# Altium footprint library Power_Lib_Altium.PcbLib: 383 footprints (part 5 of 24)
Each footprint in its own frame and in the unit in brackets; x right, y up, seen from the top. Pads: shape width x height; smd on the part's side, far side on the other; paste and mask are expansions set on the pad; w line width, h text height; cw(c..) or ccw(c..) is an arc to the next point about the centre after c.
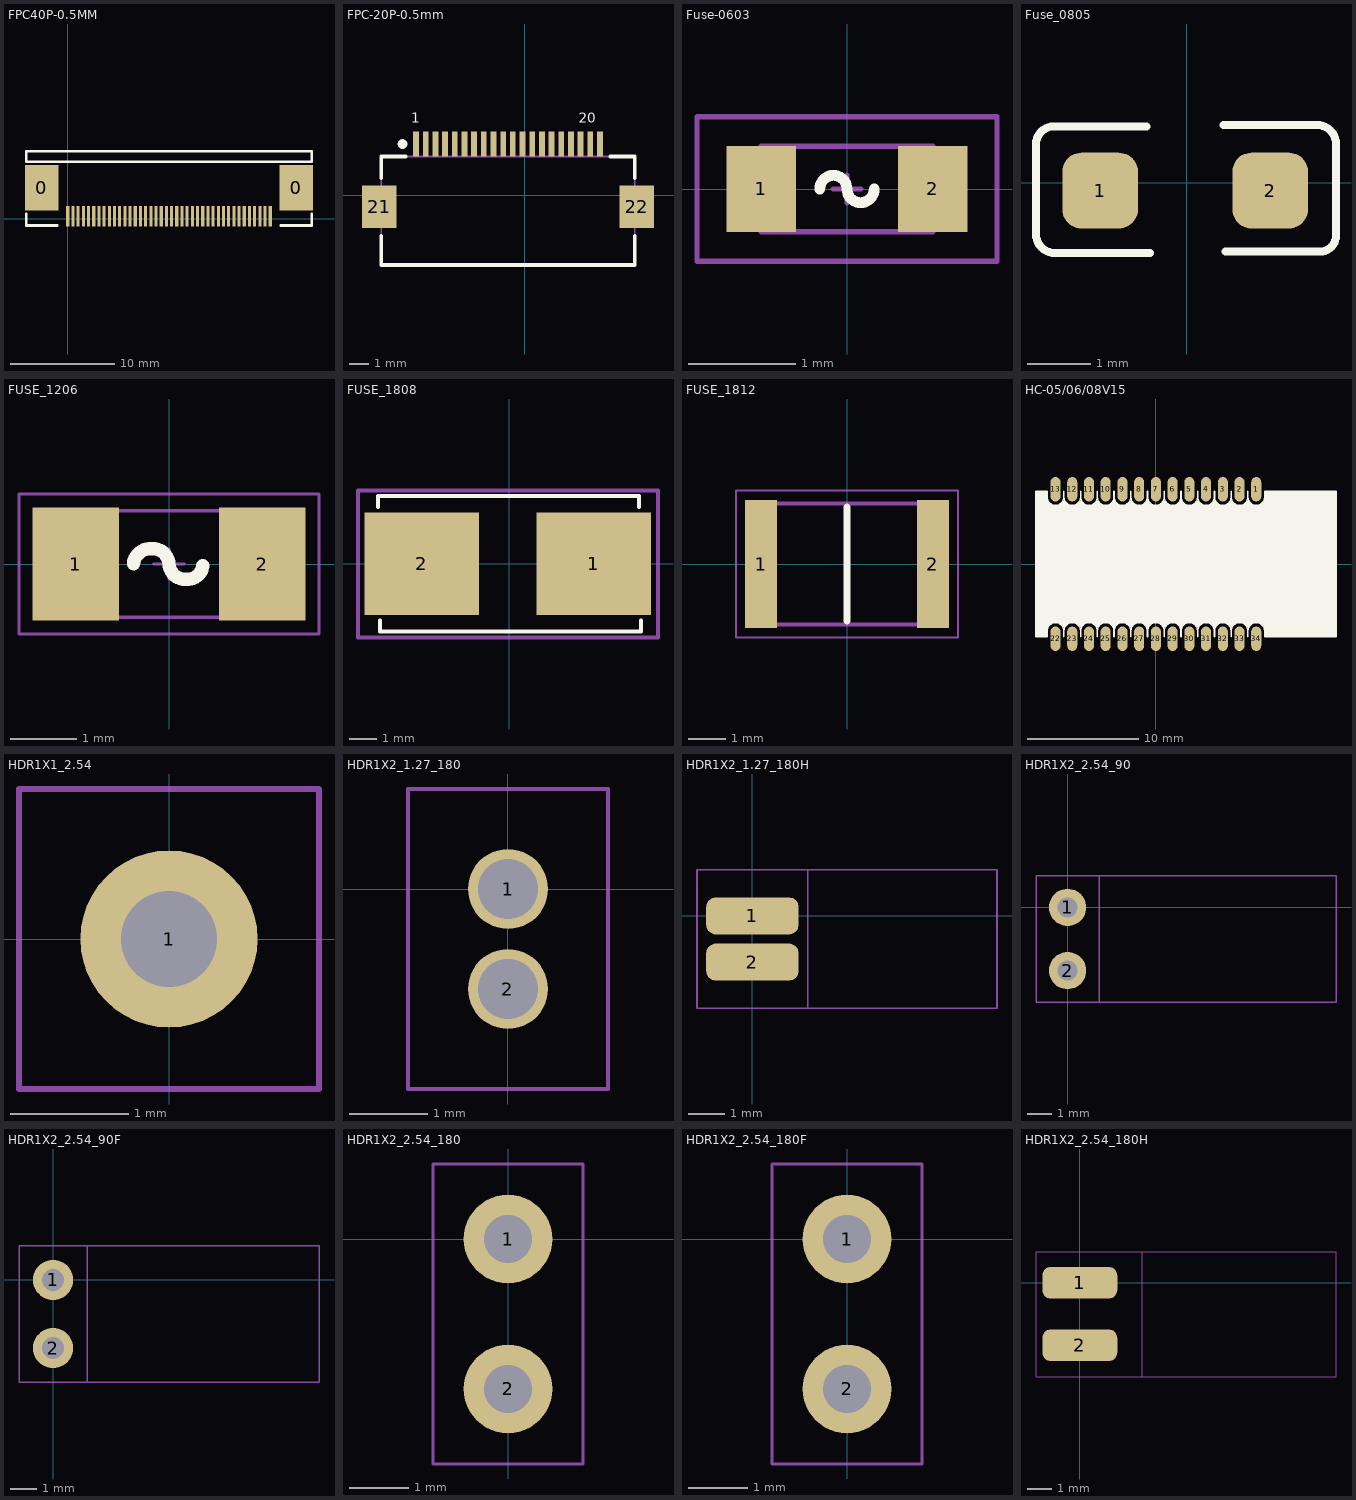
[diagram p4: the footprints below, top view; thin cyan lines are the x and y axes]

## FPC40P-0.5MM [mm]
height 1.6
pads (42):
  rect 3.2x4.4 smd: 0(-2.5,3) 0(22,3)
  rect 0.3x2 smd: 1(19.5,0.254) 2(19,0.254) 3(18.5,0.254) 4(18,0.254) 5(17.5,0.254) 6(17,0.254) 7(16.5,0.254) 8(16,0.254) 9(15.5,0.254) 10(15,0.254) 11(14.5,0.254) 12(14,0.254) 13(13.5,0.254) 14(13,0.254) 15(12.5,0.254) 16(12,0.254) 17(11.5,0.254) 18(11,0.254) 19(10.5,0.254) 20(10,0.254) 21(9.5,0.254) 22(9,0.254) 23(8.5,0.254) 24(8,0.254) 25(7.5,0.254) 26(7,0.254) 27(6.5,0.254) 28(6,0.254) 29(5.5,0.254) 30(5,0.254) 31(4.5,0.254) 32(4,0.254) 33(3.5,0.254) 34(3,0.254) 35(2.5,0.254) 36(2,0.254) 37(1.5,0.254) 38(1,0.254) 39(0.5,0.254) 40(0,0.254)
Top Overlay:
  lines w0.254: -4,0.5 -4,-0.635 -1.016,-0.635 ; 20.5,-0.635 23.5,-0.635 23.5,0.5 ; -4,5.5 -4,6.5 23.5,6.5 23.5,5.5 -4,5.5

## FPC-20P-0.5mm [mm]
pads (22):
  rect 0.3x1.3 smd: 1(-5.608,2.644) 2(-5.108,2.644) 3(-4.608,2.644) 4(-4.108,2.644) 5(-3.608,2.644) 6(-3.108,2.644) 7(-2.608,2.644) 8(-2.108,2.644) 9(-1.608,2.644) 10(-1.108,2.644) 11(-0.608,2.644) 12(-0.108,2.644) 13(0.392,2.644) 14(0.892,2.644) 15(1.392,2.644) 16(1.892,2.644) 17(2.392,2.644) 18(2.892,2.644) 19(3.392,2.644) 20(3.892,2.644)
  rect 1.8x2.2 smd: 21(-7.508,-0.606) 22(5.792,-0.604)
Top Overlay:
  circle w0.25: c-6.308,2.644 r0.125
  lines w0.2: -7.408,-2.104 -7.408,-3.604 5.692,-3.604 5.692,-2.104 ; -7.408,0.896 -7.408,1.996 -6.158,1.996 ; 4.442,1.996 5.692,1.996 5.692,0.896
  text "20" at 2.792,3.744 h0.5
  text "1" at -5.858,3.744 h0.5
Mechanical 13:
  lines w0.1: -7.408,-3.604 5.692,-3.604 5.692,1.996 -7.408,1.996 -7.408,-3.604
3D body: height 2, standoff 0, extent -7.408,-3.604 5.692,1.996

## Fuse-0603 [mm]
height 0.35
pads (2):
  rect 0.65x0.8 smd: 1(-0.8,0) 2(0.8,0)
Top Overlay:
  lines w0.1: -0.254,0 cw(c-0.127,0) -0.127,0.127 cw(c-0.127,0) 0,0 ccw(c0.127,0) 0.127,-0.127 ccw(c0.127,0) 0.254,0
Mechanical 13:
  lines w0.051: -0.127,0 0.127,0 ; 0,-0.127 0,0.127 ; -0.8,-0.4 -0.8,0.4 0.8,0.4 0.8,-0.4 -0.8,-0.4
Mechanical 14:
  lines w0.051: -1.4,-0.675 1.4,-0.675 1.4,0.675 -1.4,0.675 -1.4,-0.675
3D body "RESC1608X05L.step": height 0.45, standoff 0, extent -0.8,-0.4 0.8,0.4

## Fuse_0805 [mm] "500mA保险丝"
pads (2):
  rrect50% 1.2x1.2 smd: 1(-1.372,-0.127) 2(1.321,-0.127)
Top Overlay:
  lines w0.127: -0.635,0.889 -2.108,0.889 ccw(c-2.108,0.61) -2.388,0.61 -2.388,-0.813 ccw(c-2.083,-0.813) -2.083,-1.118 -0.584,-1.118 ; 0.584,0.914 2.057,0.914 cw(c2.057,0.61) 2.362,0.61 2.362,-0.838 cw(c2.108,-0.838) 2.108,-1.092 0.61,-1.092
3D body "User Library-fuse0805L050WR.SLDPRT": height 1.24, standoff 0, extent -1.105,-0.876 1.105,0.622

## FUSE_1206 [mm]
pads (2):
  rect 1.3x1.7 smd: 1(-1.4,0) 2(1.4,0)
Top Overlay:
  lines w0.2: -0.533,0 cw(c-0.279,-0.025) -0.254,0.229 cw(c-0.241,-0.013) 0,0 ccw(c0.241,0.013) 0.254,-0.229 ccw(c0.279,0) 0.508,-0.025
Mechanical 13:
  lines w0.051: -0.229,0 0.229,0 ; 0,-0.229 0,0.229 ; -1.6,-0.8 -1.6,0.8 1.6,0.8 1.6,-0.8 -1.6,-0.8
Mechanical 14:
  lines w0.051: -2.25,-1.05 2.25,-1.05 2.25,1.05 -2.25,1.05 -2.25,-1.05
3D body "R_1206.STEP": height 1.01, standoff -0.01, extent -1.6,-0.8 1.6,0.8

## FUSE_1808 [mm] "1808/2410保险丝座"
height 3
pads (2):
  rect 4.24x3.81 smd: 1(3.125,0) 2(-3.25,0)
Top Overlay:
  lines w0.15: -4.877,2.108 -4.877,2.515 4.801,2.515 4.801,2.108 ; -4.801,-2.108 -4.801,-2.515 4.877,-2.515 4.877,-2.108
Mechanical 14:
  lines w0.15: -5.613,-2.743 -5.613,2.718 5.512,2.718 5.512,-2.743 -5.613,-2.743
3D body "1808 Holder and Fuse.STEP": height 3.74, standoff 0.04, extent -4.9,-2.475 4.8,2.525

## FUSE_1812 [mm]
pads (2):
  rect 0.85x3.43 smd: 1(-2.3,0) 2(2.3,0)
Top Overlay:
  lines w0.2: 0,-1.52 0,1.52
Mechanical 13:
  lines w0.1: -2.275,-1.62 2.275,-1.62 2.275,1.62 -2.275,1.62 -2.275,-1.62
Mechanical 15:
  lines w0.05: -2.975,-1.965 2.975,-1.965 2.975,1.965 -2.975,1.965 -2.975,-1.965
3D body "MF-MSMF050-2.stp": height 0.85, standoff 0, extent -2.275,-1.62 2.275,1.62

## HC-05/06/08V15 [mm]
pads (26):
  oval 0.9x2.2 smd: 1(9,6.7) 2(7.5,6.7) 3(6,6.7) 4(4.5,6.7) 5(3,6.7) 6(1.5,6.7) 7(0,6.7) 8(-1.5,6.7) 9(-3,6.7) 10(-4.5,6.7) 11(-6,6.7) 12(-7.5,6.7) 13(-9,6.7) 22(-9,-6.7) 23(-7.5,-6.7) 24(-6,-6.7) 25(-4.5,-6.7) 26(-3,-6.7) 27(-1.5,-6.7) 28(0,-6.7) 29(1.5,-6.7) 30(3,-6.7) 31(4.5,-6.7) 32(6,-6.7) 33(7.5,-6.7) 34(9,-6.7)
Top Overlay:
  rectangle: -9.75,-5.675 -9.6,-5.475
  rectangle: -9.75,-5.475 -9.425,-5.3
  rectangle: -9.75,5.475 -9.6,5.675
  rectangle: -9.75,5.3 -9.425,5.475
  rectangle: -9.75,-5.3 9.75,5.3
  rectangle: 9.75,-6.5 16.15,6.5
  rectangle: -10.75,-6.5 -9.75,6.5
  rectangle: 9.59,-5.66 9.91,-5.4
  rectangle: 9.4,-5.425 10.1,-5.275
  rectangle: 8.09,-5.66 8.41,-5.4
  rectangle: 7.9,-5.425 8.6,-5.275
  rectangle: 6.59,-5.66 6.91,-5.4
  rectangle: 6.4,-5.425 7.1,-5.275
  rectangle: 5.09,-5.66 5.41,-5.4
  rectangle: 4.9,-5.425 5.6,-5.275
  rectangle: 3.59,-5.66 3.91,-5.4
  rectangle: 3.4,-5.425 4.1,-5.275
  rectangle: 2.09,-5.66 2.41,-5.4
  rectangle: 1.9,-5.425 2.6,-5.275
  rectangle: 0.59,-5.66 0.91,-5.4
  rectangle: 0.4,-5.425 1.1,-5.275
  rectangle: -0.91,-5.66 -0.59,-5.4
  rectangle: -1.1,-5.425 -0.4,-5.275
  rectangle: -2.41,-5.66 -2.09,-5.4
  rectangle: -2.6,-5.425 -1.9,-5.275
  rectangle: -3.91,-5.66 -3.59,-5.4
  rectangle: -4.1,-5.425 -3.4,-5.275
  rectangle: -5.41,-5.66 -5.09,-5.4
  rectangle: -5.6,-5.425 -4.9,-5.275
  rectangle: -6.91,-5.66 -6.59,-5.4
  rectangle: -7.1,-5.425 -6.4,-5.275
  rectangle: -8.41,-5.66 -8.09,-5.4
  rectangle: -8.6,-5.425 -7.9,-5.275
  rectangle: 9.59,5.4 9.91,5.66
  rectangle: 9.4,5.275 10.1,5.425
  rectangle: 8.09,5.4 8.41,5.66
  rectangle: 7.9,5.275 8.6,5.425
  rectangle: 6.59,5.4 6.91,5.66
  rectangle: 6.4,5.275 7.1,5.425
  rectangle: 5.09,5.4 5.41,5.66
  rectangle: 4.9,5.275 5.6,5.425
  rectangle: 3.59,5.4 3.91,5.66
  rectangle: 3.4,5.275 4.1,5.425
  rectangle: 2.09,5.4 2.41,5.66
  rectangle: 1.9,5.275 2.6,5.425
  rectangle: 0.59,5.4 0.91,5.66
  rectangle: 0.4,5.275 1.1,5.425
  rectangle: -0.91,5.4 -0.59,5.66
  rectangle: -1.1,5.275 -0.4,5.425
  rectangle: -2.41,5.4 -2.09,5.66
  rectangle: -2.6,5.275 -1.9,5.425
  rectangle: -3.91,5.4 -3.59,5.66
  rectangle: -4.1,5.275 -3.4,5.425
  rectangle: -5.41,5.4 -5.09,5.66
  rectangle: -5.6,5.275 -4.9,5.425
  rectangle: -6.91,5.4 -6.59,5.66
  rectangle: -7.1,5.275 -6.4,5.425
  rectangle: -8.41,5.4 -8.09,5.66
  rectangle: -8.6,5.275 -7.9,5.425
  lines w0.152: -8.25,-5.85 -8.25,-6.5 -8.25,-6 ; 9.75,-6 ccw(c9,-6) 8.25,-6 ccw(c7.5,-6) 6.75,-6 ccw(c6,-6) 5.25,-6 ccw(c4.5,-6) 3.75,-6 ccw(c3,-6) 2.25,-6 ccw(c1.5,-6) 0.75,-6 ccw(c0,-6) -0.75,-6 ccw(c-1.5,-6) -2.25,-6 ccw(c-3,-6) -3.75,-6 ccw(c-4.5,-6) -5.25,-6 ccw(c-6,-6) -6.75,-6 ccw(c-7.5,-6) -8.25,-6 ; 9.75,-5.85 9.75,-6.5 16.15,-6.5 16.15,6.5 9.75,6.5 9.75,6 cw(c9,6) 8.25,6 ; -8.25,-6 ccw(c-9,-6) -9.75,-6 -9.75,-6.5 -10.75,-6.5 -10.75,6.5 -9.75,6.5 -9.75,6 ccw(c-9,6) -8.25,6 ; -8.25,6 ccw(c-7.5,6) -6.75,6 ; -8.25,6 -8.25,6.5 -8.25,6 ; -6.75,6 ccw(c-6,6) -5.25,6 ; -6.75,6 -6.75,6.5 -6.75,6 ; -5.25,6 ccw(c-4.5,6) -3.75,6 ; -5.25,6 -5.25,6.5 -5.25,6 ; -3.75,6 ccw(c-3,6) -2.25,6 ; -3.75,6 -3.75,6.5 -3.75,6 ; -2.25,6 ccw(c-1.5,6) -0.75,6 ; -2.25,6 -2.25,6.5 -2.25,6 ; -0.75,6 ccw(c0,6) 0.75,6 ; -0.75,6 -0.75,6.5 -0.75,6 ; 0.75,6 ccw(c1.5,6) 2.25,6 ; 0.75,6 0.75,6.5 0.75,6 ; 2.25,6 ccw(c3,6) 3.75,6 ; 2.25,6 2.25,6.5 2.25,6 ; 3.75,6 ccw(c4.5,6) 5.25,6 ; 3.75,6 3.75,6.5 3.75,6 ; 5.25,6 ccw(c6,6) 6.75,6 ; 5.25,6 5.25,6.5 5.25,6 ; 6.75,6 ccw(c7.5,6) 8.25,6 ; 6.75,6 6.75,6.5 6.75,6 ; 8.25,6 8.25,6.5 8.25,6 ; -6.75,-6.5 -6.75,-5.85 -6.75,-6.5 ; -5.25,-6.5 -5.25,-5.85 -5.25,-6.5 ; -3.75,-6.5 -3.75,-5.85 -3.75,-6.5 ; -2.25,-6.5 -2.25,-5.85 -2.25,-6.5 ; -0.75,-6.5 -0.75,-5.85 -0.75,-6.5 ; 0.75,-6.5 0.75,-5.85 0.75,-6.5 ; 2.25,-6.5 2.25,-5.85 2.25,-6.5 ; 3.75,-6.5 3.75,-5.85 3.75,-6.5 ; 5.25,-6.5 5.25,-5.85 5.25,-6.5 ; 6.75,-6.5 6.75,-5.85 6.75,-6.5 ; 8.25,-6.5 8.25,-5.85 8.25,-6.5
3D body "HC05(06).STEP": height 4.31, standoff 0, extent -10.77,-6.5 16.231,6.5

## HDR1X1_2.54 [mm]
height 4.3
pads (1):
  round 1.5 hole 0.813: 1(0,0)
Mechanical 13:
  lines w0.051: -1.27,-1.27 -1.27,1.27 1.27,1.27 1.27,-1.27 -1.27,-1.27
Mechanical 14:
  lines w0.051: -1.27,-1.27 -1.27,1.27 1.27,1.27 1.27,-1.27 -1.27,-1.27

## HDR1X2_1.27_180 [mil]
height 169.29
pads (2):
  round 40 hole 30: 1(0,0) 2(0,-50)
Mechanical 13:
  lines w2: -50,-100 -50,50 50,50 50,-100 -50,-100
Mechanical 14:
  lines w2: -50,-100 -50,50 50,50 50,-100 -50,-100
3D body "pin_header_a-sl127-eg-g02d.stp": height 210.24, standoff -102.36, extent -49.21,-74.99 49.21,25.01

## HDR1X2_1.27_180H [mil]
height 169.29
pads (2):
  rrect50% 100x40 smd: 1(0,0) 2(0,-50)
Mechanical 13:
  lines w2: -60,-100 -60,50 265,50 265,-100 -60,-100
Mechanical 14:
  lines w2: -60,-100 -60,50 60,50 60,-100 -60,-100
3D body "pin_header_a-sl127-eg-g02d.stp": height 49.21, standoff -49.21, extent -47.36,-74.99 265.24,25.01

## HDR1X2_2.54_90 [mm]
height 4.3
pads (2):
  round 1.5 hole 0.813: 1(0,0) 2(0,-2.54)
Mechanical 13:
  lines w0.051: -1.27,-3.81 10.795,-3.81 10.795,1.27 -1.27,1.27 -1.27,-3.81
Mechanical 14:
  lines w0.051: -1.27,-3.81 -1.27,1.27 1.27,1.27 1.27,-3.81 -1.27,-3.81
3D body "pin_header_aw140-ea-g02g.stp": height 2.52, standoff -2.38, extent -0.381,-3.71 10.759,1.17

## HDR1X2_2.54_90F [mm]
height 4.3
pads (2):
  round 1.5 hole 0.813: 1(0,0) 2(0,-2.54)
Mechanical 13:
  lines w0.051: -1.27,-3.81 9.906,-3.81 9.906,1.27 -1.27,1.27 -1.27,-3.81
Mechanical 14:
  lines w0.051: -1.27,-3.81 1.27,-3.81 1.27,1.27 -1.27,1.27 -1.27,-3.81
3D body "female_header_a-bl254-ea-g02d.stp": height 2.52, standoff -3.18, extent -0.254,-3.935 9.806,1.395

## HDR1X2_2.54_180 [mm]
height 4.3
pads (2):
  round 1.5 hole 0.813: 1(0,0) 2(0,-2.54)
Mechanical 13:
  lines w0.051: -1.27,-3.81 1.27,-3.81 1.27,1.27 -1.27,1.27 -1.27,-3.81
Mechanical 14:
  lines w0.051: -1.27,-3.81 1.27,-3.81 1.27,1.27 -1.27,1.27 -1.27,-3.81
3D body "pin_header_aw140-eg-g02d.stp": height 8.2, standoff -3, extent -1.249,-3.81 1.249,1.27

## HDR1X2_2.54_180F [mm]
height 4.3
pads (2):
  round 1.5 hole 0.813: 1(0,0) 2(0,-2.54)
Mechanical 13:
  lines w0.051: -1.27,-3.81 -1.27,1.27 1.27,1.27 1.27,-3.81 -1.27,-3.81
Mechanical 14:
  lines w0.051: -1.27,-3.81 1.27,-3.81 1.27,1.27 -1.27,1.27 -1.27,-3.81
3D body "female_header_a-bl254-eg-g02d.stp": height 8.5, standoff -3.2, extent -1.25,-3.935 1.25,1.395

## HDR1X2_2.54_180H [mil]
height 169.29
pads (2):
  rrect50% 120x50 smd: 1(0,0) 2(0,-100)
Mechanical 13:
  lines w2: -70,-150 -70,50 410,50 410,-150 -70,-150
Mechanical 14:
  lines w2: -70,-150 100,-150 100,50 -70,50 -70,-150
3D body "pin_header_aw140-eg-g02d.stp": height 61.32, standoff -37.05, extent -35,-150 405.94,50